# Altium footprint library kalios.PcbLib: 404 footprints (part 22 of 26)
Each footprint in its own frame and in the unit in brackets; x right, y up, seen from the top. Pads: shape width x height; smd on the part's side, far side on the other; paste and mask are expansions set on the pad; w line width, h text height; cw(c..) or ccw(c..) is an arc to the next point about the centre after c.
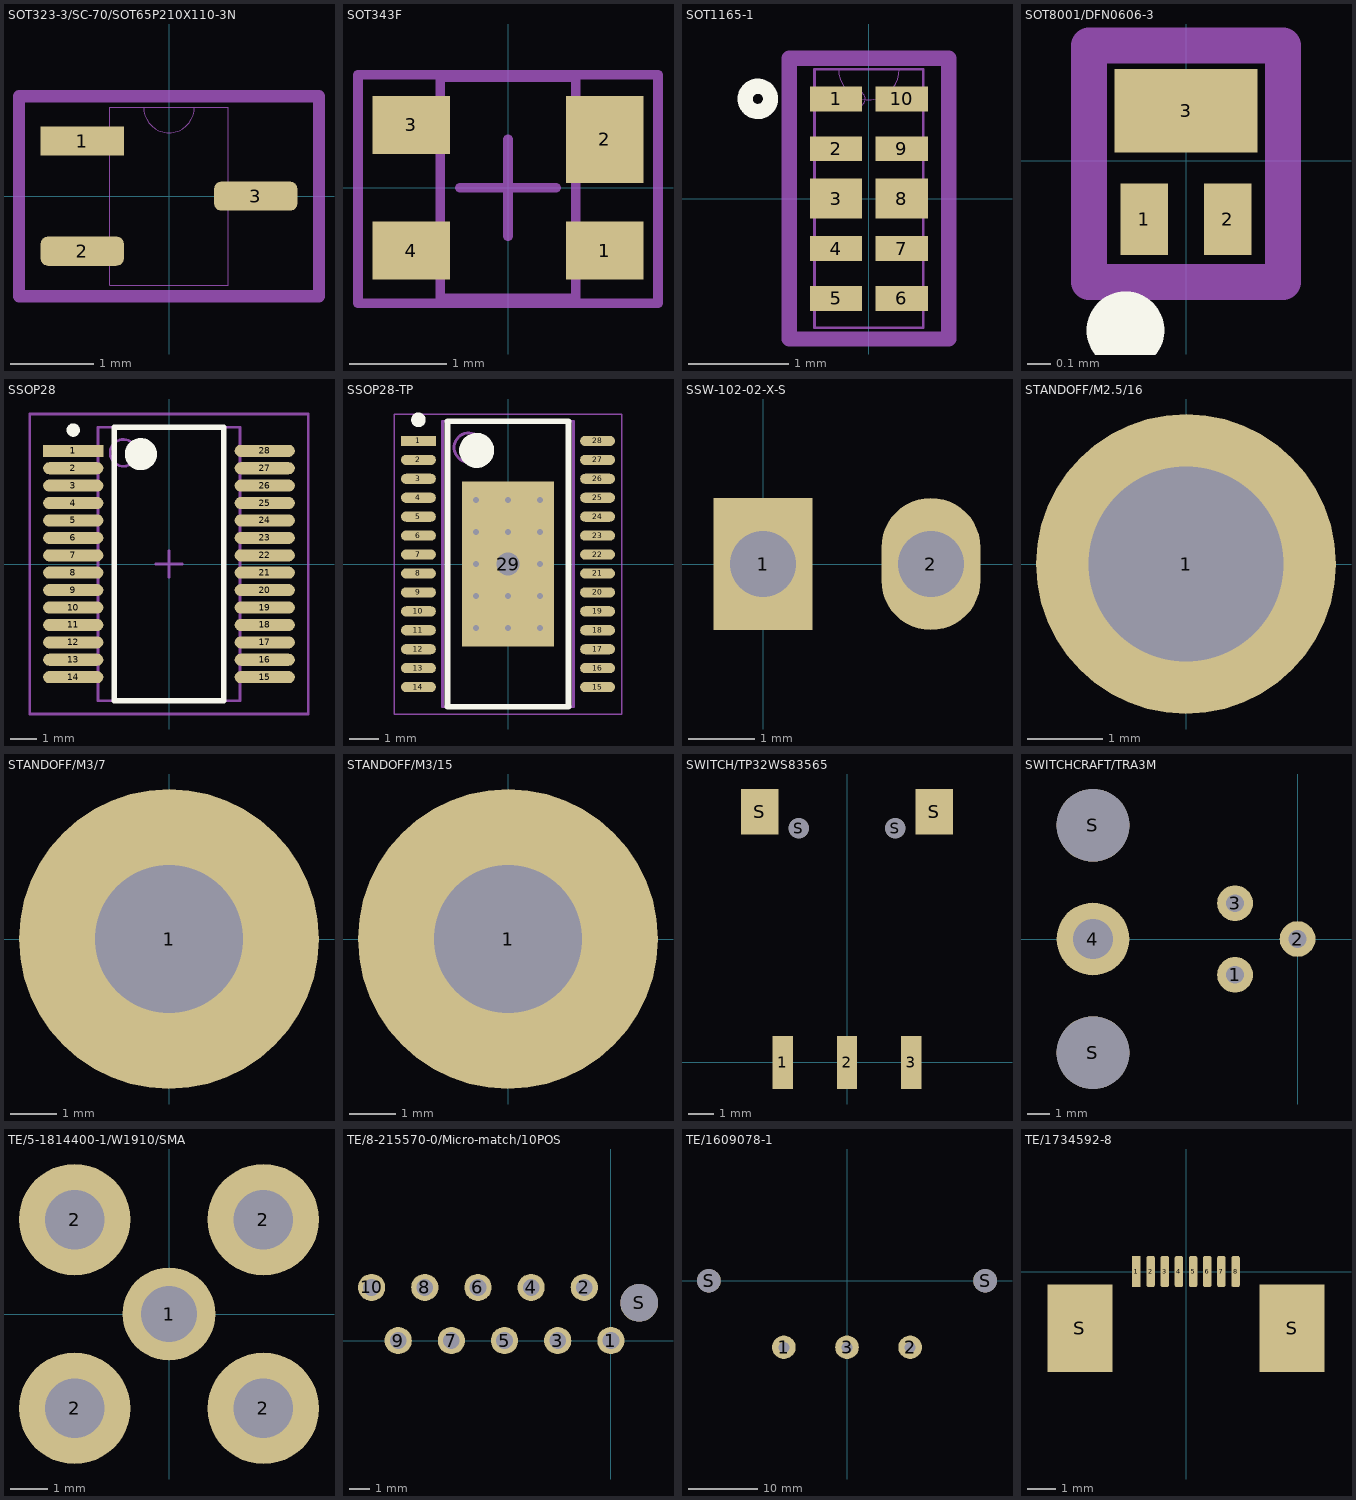
[diagram p21: the footprints below, top view; thin cyan lines are the x and y axes]

## SOT323-3/SC-70/SOT65P210X110-3N [mm]
pads (3):
  rect 1x0.35 smd: 1(-1.041,0.66)
  rrect50% 1x0.35 smd: 2(-1.041,-0.66) 3(1.041,0)
Top 3D Body:
  lines w0: -0.711,-0.787 -1.194,-0.787 -1.194,-0.508 -0.711,-0.508 ; -0.711,-0.787 -0.711,-0.508 ; -0.711,-0.787 -0.711,-1.067 0.711,-1.067 0.711,-0.152 ; -0.711,-0.508 -0.711,0.508 ; -0.711,0.508 -1.194,0.508 -1.194,0.787 -0.711,0.787 ; -0.711,0.508 -0.711,0.787 ; -0.711,0.787 -0.711,1.067 -0.305,1.067 ; -0.305,1.067 ccw(c0,1.067) 0.305,1.067 ; -0.305,1.067 0.305,1.067 ; 0.305,1.067 0.711,1.067 0.711,0.152 ; 0.711,-0.152 1.194,-0.152 1.194,0.152 0.711,0.152 ; 0.711,-0.152 0.711,0.152
Top Courtyard:
  lines w0.15: -1.8,-1.2 -1.8,1.2 1.8,1.2 1.8,-1.2 -1.8,-1.2
Top Designator:
  text ".Designator" at -2.999,-0.2 h0.6
3D body "User Library-sc70-3.step": height 1, standoff 0, extent -1.15,-1.05 1.15,1.05

## SOT343F [mm] "SOT23, 5-Leads, Body 3.0x2.6mm (max), Pitch 0.95mm, IPC Low Density"
height 2
pads (4):
  rect 0.8x0.6 smd: 1(1,-0.65) 3(-1,0.65) 4(-1,-0.65)
  rect 0.8x0.9 smd: 2(1,0.5)
Top 3D Body:
  lines w0.1: -0.7,-1.143 0.7,-1.143 0.7,1.143 -0.7,1.143 -0.7,-1.143
Top Courtyard:
  lines w0.1: -0.5,0 0.5,0 ; 0,-0.5 0,0.5 ; -1.549,-1.194 1.549,-1.194 1.549,1.168 -1.549,1.168 -1.549,-1.194
Top Designator:
  text ".Designator" at -7.618,-0.521 h1.52
3D body "SOT343F.STEP": height 0.75, standoff 0, extent -1.179,-1.1 1.131,1.1

## SOT1165-1 [mm]
pads (10):
  rect 0.525x0.25 smd paste-0.152 mask+0: 1(-0.33,1) 2(-0.33,0.5) 4(-0.33,-0.5) 5(-0.33,-1) 6(0.33,-1) 7(0.33,-0.5) 9(0.33,0.5) 10(0.33,1)
  rect 0.525x0.4 smd paste+0 mask+0: 3(-0.33,0) 8(0.33,0)
Top Overlay:
  circle w0.152: c-1.114,1 r0.127
Top 3D Body:
  circle w0: c-0.114,1 r0.076
  lines w0: -0.305,1.295 ccw(c0,1.295) 0.305,1.295
  lines w0.025: -0.546,-1.295 -0.546,1.295 0.546,1.295 0.546,-1.295 -0.546,-1.295
Top Courtyard:
  lines w0.152: -0.8,-1.407 0.8,-1.407 0.8,1.407 -0.8,1.407 -0.8,-1.407
Top Designator:
  text ".Designator" at -7.838,-0.508 h1.52
3D body "SOT1165-1.STEP": height 0.45, standoff -0.02, extent -0.501,-1.25 0.499,1.25

## SOT8001/DFN0606-3 [mm]
pads (3):
  rect 0.2x0.3 smd: 1(-0.175,-0.245) 2(0.175,-0.245)
  rect 0.6x0.35 smd: 3(0,0.21)
Top Overlay:
  circle w0.254: c-0.254,-0.711 r0.036
Top Assembly (Mech11):
  lines w0.152: -0.406,-0.508 -0.406,0.483 0.406,0.483 0.406,-0.508 -0.406,-0.508
3D body "SOT8001.STEP": height 0.37, standoff 0, extent -0.305,-0.31 0.315,0.31

## SSOP28 [mm]
height 2
pads (28):
  rect 2.25x0.45 smd: 1(-3.575,4.225)
  oval 2.25x0.45 smd: 2(-3.575,3.575) 3(-3.575,2.925) 4(-3.575,2.275) 5(-3.575,1.625) 6(-3.575,0.975) 7(-3.575,0.325) 8(-3.575,-0.325) 9(-3.575,-0.975) 10(-3.575,-1.625) 11(-3.575,-2.275) 12(-3.575,-2.925) 13(-3.575,-3.575) 14(-3.575,-4.225) 15(3.575,-4.225) 16(3.575,-3.575) 17(3.575,-2.925) 18(3.575,-2.275) 19(3.575,-1.625) 20(3.575,-0.975) 21(3.575,-0.325) 22(3.575,0.325) 23(3.575,0.975) 24(3.575,1.625) 25(3.575,2.275) 26(3.575,2.925) 27(3.575,3.575) 28(3.575,4.225)
Top Overlay:
  circle w0.25: c-3.575,5 r0.125
  circle w0.6: c-1.05,4.1 r0.3
  lines w0.2: -2.05,-5.1 -2.05,5.1 2.05,5.1 2.05,-5.1 -2.05,-5.1
Top 3D Body:
  circle w0.1: c-1.7,4.15 r0.5
  lines w0.1: -2.65,-5.1 -2.65,5.1 2.65,5.1 2.65,-5.1 -2.65,-5.1
Top Courtyard:
  lines w0.1: -0.5,0 0.5,0 ; 0,-0.5 0,0.5 ; -5.2,-5.6 -5.2,5.6 5.2,5.6 5.2,-5.6 -5.2,-5.6
Top Designator:
  text ".Designator" at -7.618,-0.508 h1.52
3D body "User Library-SSOP-28.STEP": height 1.92, standoff -0.03, extent -4.087,-5.242 4.138,5.258

## SSOP28-TP [mm]
height 1.1
pads (29):
  rect 1.2x0.35 smd: 1(-3.075,4.225)
  oval 1.2x0.35 smd: 2(-3.075,3.575) 3(-3.075,2.925) 4(-3.075,2.275) 5(-3.075,1.625) 6(-3.075,0.975) 7(-3.075,0.325) 8(-3.075,-0.325) 9(-3.075,-0.975) 10(-3.075,-1.625) 11(-3.075,-2.275) 12(-3.075,-2.925) 13(-3.075,-3.575) 14(-3.075,-4.225) 15(3.075,-4.225) 16(3.075,-3.575) 17(3.075,-2.925) 18(3.075,-2.275) 19(3.075,-1.625) 20(3.075,-0.975) 21(3.075,-0.325) 22(3.075,0.325) 23(3.075,0.975) 24(3.075,1.625) 25(3.075,2.275) 26(3.075,2.925) 27(3.075,3.575) 28(3.075,4.225)
  rect 3.15x5.65 smd: 29(0,0)
via 1.1,-2.2 diameter 0.5 hole 0.2
via 0,-2.2 diameter 0.5 hole 0.2
via -1.1,-2.2 diameter 0.5 hole 0.2
via 1.1,-1.1 diameter 0.5 hole 0.2
via 0,-1.1 diameter 0.5 hole 0.2
via -1.1,-1.1 diameter 0.5 hole 0.2
via 1.1,0 diameter 0.5 hole 0.2
via 0,0 diameter 1 hole 0.8
via -1.1,0 diameter 0.5 hole 0.2
via 1.1,1.1 diameter 0.5 hole 0.2
via 0,1.1 diameter 0.5 hole 0.2
via -1.1,1.1 diameter 0.5 hole 0.2
via 1.1,2.2 diameter 0.5 hole 0.2
via 0,2.2 diameter 0.5 hole 0.2
via -1.1,2.2 diameter 0.5 hole 0.2
Top Overlay:
  circle w0.6: c-1.075,3.9 r0.3
  circle w0.25: c-3.075,4.95 r0.125
  lines w0.2: -2.075,-4.9 2.075,-4.9 2.075,4.9 -2.075,4.9 -2.075,-4.9
Top 3D Body:
  circle w0.1: c-1.35,4 r0.5
  lines w0.1: -2.25,-4.9 2.25,-4.9 2.25,4.9 -2.25,4.9 -2.25,-4.9
Top Courtyard:
  lines w0.05: -3.9,-5.15 3.9,-5.15 3.9,5.15 -3.9,5.15 -3.9,-5.15
  lines w0.1: -0.5,0 0.5,0 ; 0,-0.5 0,0.5
Top Designator:
  text ".Designator" at -7.618,-0.495 h1.52
3D body "TSSOP28.STEP": height 1.12, standoff -0.03, extent -3.276,-4.85 3.124,4.85

## SSW-102-02-X-S [mm]
pads (2):
  rect 1.5x2 hole 1 unplated: 1(0,0)
  oval 1.5x2 hole 1 unplated: 2(2.54,0)
Top Designator:
  text ".Designator" at -6.322,-0.521 h1.52
3D body "SSW-103-02-X-S.STEP": height 8.41, standoff -4.93, extent -1.499,-1.219 4.089,1.194

## STANDOFF/M2.5/16 [mm]
pads (1):
  round 4 hole 2.6 unplated: 1(0,0)
Top Designator:
  text ".Designator" at -7.618,-0.508 h1.52
3D body "standoffm2.5x16.5.STEP": height -0.5, standoff -17, extent -1.736,-2.051 1.753,1.949

## STANDOFF/M3/7 [mm]
pads (1):
  round 6.5 hole 3.2 unplated: 1(0,0)
Top Designator:
  text ".Designator" at -7.618,-0.508 h1.52
3D body "standoffm3x6.5.STEP": height -0.5, standoff -7, extent -3.176,-2.757 3.175,2.757

## STANDOFF/M3/15 [mm]
pads (1):
  round 6.5 hole 3.2 unplated: 1(0,0)
Top Designator:
  text ".Designator" at -7.618,-0.508 h1.52
3D body "pillar_289630055018.STEP": height 18, standoff -6, extent -2.75,-3.176 2.75,3.175

## SWITCH/TP32WS83565 [mm]
pads (7):
  rect 0.8x2.1 smd: 1(-2.54,0) 2(0,0) 3(2.54,0)
  rect 1.5x1.8 smd: S(-3.45,9.91) S(3.45,9.91)
  round 0.8 hole 0.8 unplated: S(-1.905,9.26) S(1.905,9.26)
Top Designator:
  text ".Designator" at -7.618,8.715 h1.52
3D body "TP32WS83565.STEP": height 5.6, standoff -1, extent -4.061,-0.852 4.039,19.598

## SWITCHCRAFT/TRA3M [mil]
pads (6):
  round 62.99 hole 31.5: 1(-110,-63) 2(0,0) 3(-110,63)
  round 128 hole 70: 4(-360,0)
  round 128 hole 128 unplated: S(-360,-200) S(-360,200)
Top Designator:
  text ".Designator" at -717.4,-20.99 h60
3D body "TRA3M_SW0001.STEP": height 614.37, standoff -130.63, extent -950,-303.5 115,301.5

## TE/5-1814400-1/W1910/SMA [mm]
pads (5):
  round 2.5 hole 1.5: 1(0,0)
  round 3 hole 1.6: 2(-2.54,-2.54) 2(-2.54,2.54) 2(2.54,-2.54) 2(2.54,2.54)
Top Designator:
  text ".Designator" at -7.567,-25.469 h1.52
3D body "antenna.STEP": height 12.54, standoff -3.43, extent -5.265,-54.064 5.367,3.2

## TE/8-215570-0/Micro-match/10POS [mm]
pads (11):
  round 1.3 hole 0.8: 1(0,0) 2(-1.27,2.54) 3(-2.54,0) 4(-3.81,2.54) 5(-5.08,0) 6(-6.35,2.54) 7(-7.62,0) 8(-8.89,2.54) 9(-10.16,0) 10(-11.43,2.54)
  round 1.8 hole 1.8 unplated: S(1.35,1.8)
Top Designator:
  text ".Designator" at -13.319,0.813 h1.52
3D body "C-8-215570-0.STEP": height 5.25, standoff -3.05, extent -13.755,-1.179 2.325,3.821

## TE/1609078-1 [mil]
pads (5):
  oval 135x134 hole 63: 1(-360,-380) 2(360,-380) 3(0,-380)
  oval 135x134 hole 134 unplated: S(-787.5,0) S(787.5,0)
Top Designator:
  text ".Designator" at -299.9,-15.74 h60
3D body "C-1609078-1.STEP": height 1088.75, standoff -145.62, extent -976.56,-460.25 976.56,468.75

## TE/1734592-8 [mm]
pads (10):
  rect 0.3x1.1 smd: 1(-1.75,0)
  rrect50% 0.3x1.1 smd: 2(-1.25,0) 3(-0.75,0) 4(-0.25,0) 5(0.25,0) 6(0.75,0) 7(1.25,0) 8(1.75,0)
  rect 2.3x3.1 smd: S(-3.75,-2) S(3.75,-2)
Top Designator:
  text ".Designator" at -7.618,-2.612 h1.52
3D body "C-1734592-8-B-3D.STEP": height 2.05, standoff 0, extent -4.715,-4.86 4.715,0.25